# Altium footprint library WE-SHC.PcbLib: 139 footprints (part 6 of 10)
Each footprint in its own frame and in the unit in brackets; x right, y up, seen from the top. Pads: shape width x height; smd on the part's side, far side on the other; paste and mask are expansions set on the pad; w line width, h text height; cw(c..) or ccw(c..) is an arc to the next point about the centre after c.
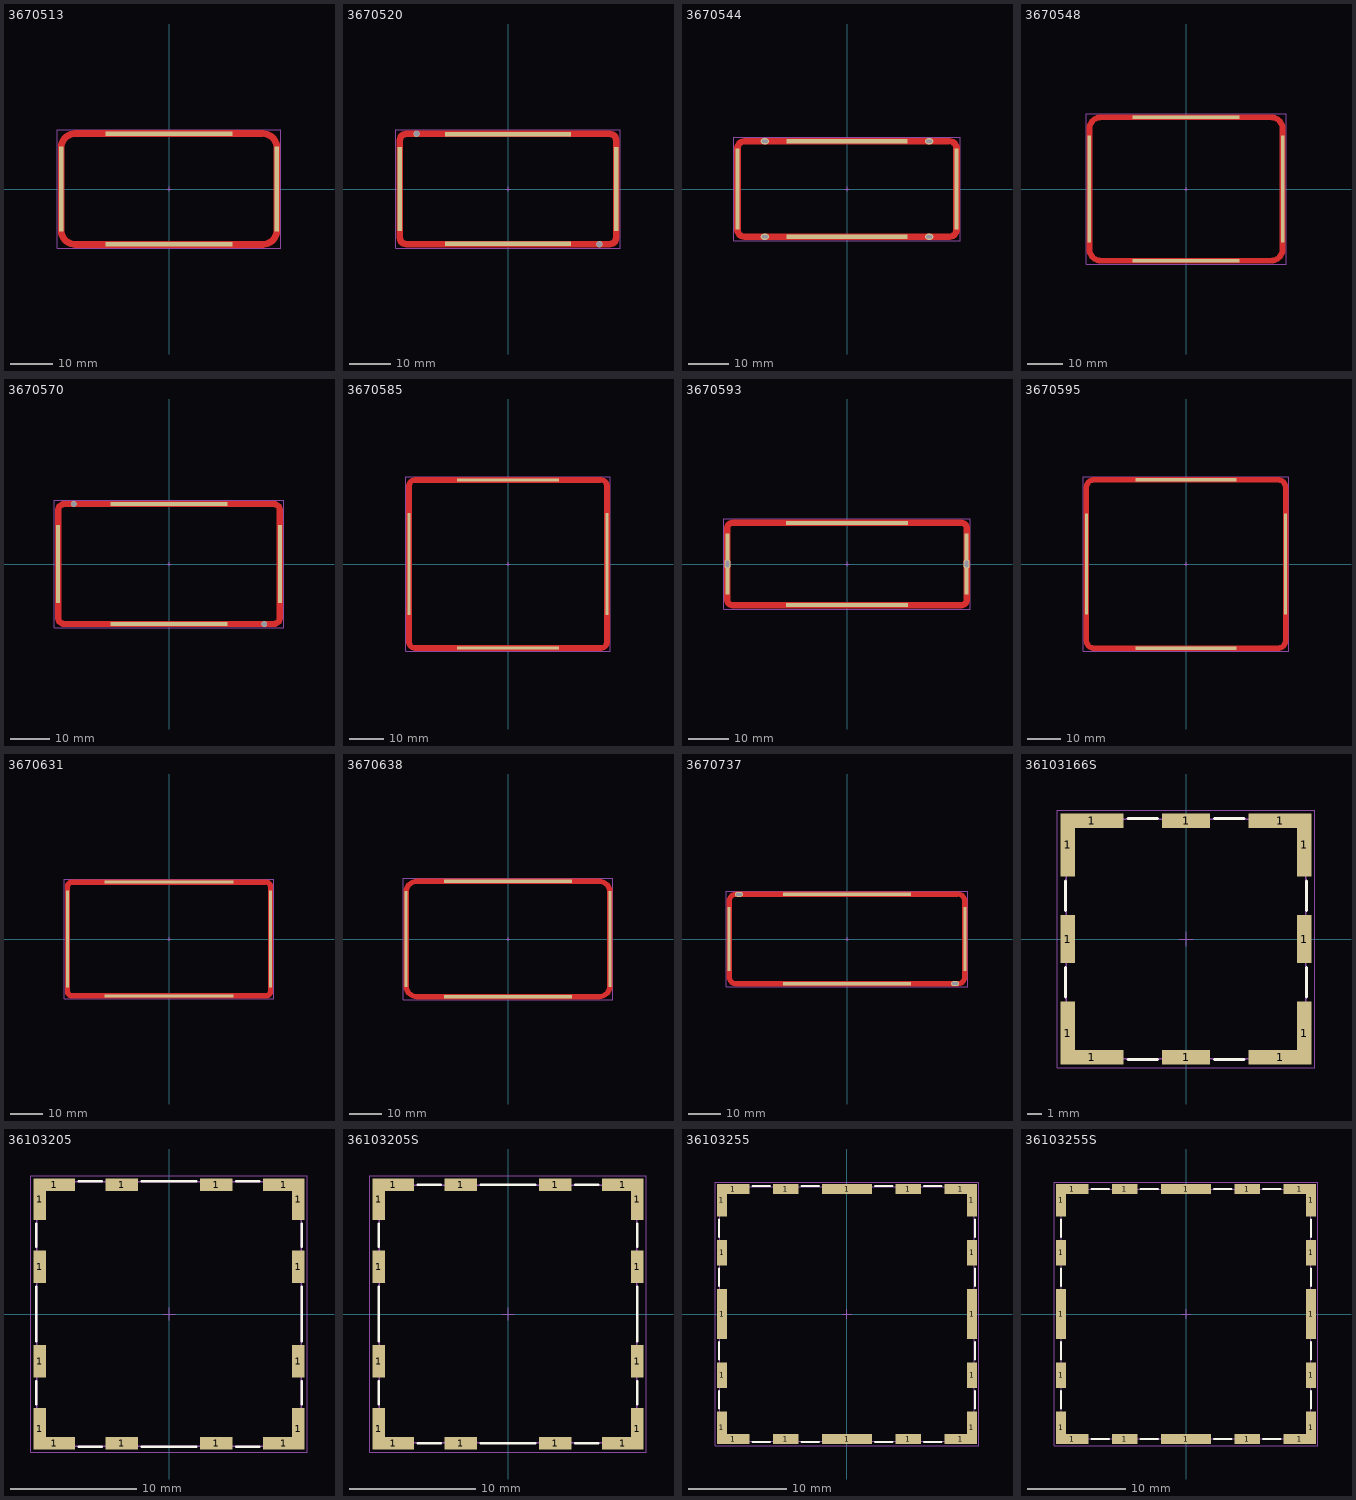
[diagram p5: the footprints below, top view; thin cyan lines are the x and y axes]

## 3670513 [mm] "Shielding Cabinet, SMT Frame Seamless, 51.3x26.5x9.5mm"
height 9.5
pads (4):
  rect 1x20 smd paste-2539.97 mask-2222: 1(-25.5,0) 1(25.5,0)
  rect 30x1 smd paste-2539.97 mask-2222: 1(0,-13.1) 1(0,13.1)
Top Layer:
  region: -26.25,-0.5 -26.25,-9.75 -26.25,-10.019 -26.18,-10.552 -26.041,-11.071 -25.835,-11.567 -25.566,-12.033 -25.239,-12.459 -24.859,-12.839 -24.433,-13.166 -23.967,-13.435 -23.471,-13.641 -22.952,-13.78 -22.419,-13.85 -22.15,-13.85 22.15,-13.85 22.419,-13.85 22.952,-13.78 23.471,-13.641 23.967,-13.435 24.433,-13.166 24.859,-12.839 25.239,-12.459 25.566,-12.033 25.835,-11.567 26.041,-11.071 26.18,-10.552 26.25,-10.019 26.25,-9.75 26.25,-0.5 24.75,-0.5 24.75,-9.75 24.737,-10.005 24.638,-10.505 24.443,-10.976 24.16,-11.399 23.799,-11.76 23.376,-12.043 22.905,-12.238 22.405,-12.337 22.15,-12.35 -22.15,-12.35 -22.405,-12.337 -22.905,-12.238 -23.376,-12.043 -23.799,-11.76 -24.16,-11.399 -24.443,-10.976 -24.638,-10.505 -24.737,-10.005 -24.75,-9.75 -24.75,-0.5
  region: -26.25,-1 -26.25,9.75 -26.25,10.019 -26.18,10.552 -26.041,11.071 -25.835,11.567 -25.566,12.033 -25.239,12.459 -24.859,12.839 -24.433,13.166 -23.967,13.435 -23.471,13.641 -22.952,13.78 -22.419,13.85 -22.15,13.85 22.15,13.85 22.419,13.85 22.952,13.78 23.471,13.641 23.967,13.435 24.433,13.166 24.859,12.839 25.239,12.459 25.566,12.033 25.835,11.567 26.041,11.071 26.18,10.552 26.25,10.019 26.25,9.75 26.25,-1 24.75,-1 24.75,9.75 24.737,10.005 24.638,10.505 24.443,10.976 24.16,11.399 23.799,11.76 23.376,12.043 22.905,12.238 22.405,12.337 22.15,12.35 -22.15,12.35 -22.405,12.337 -22.905,12.238 -23.376,12.043 -23.799,11.76 -24.16,11.399 -24.443,10.976 -24.638,10.505 -24.737,10.005 -24.75,9.75 -24.75,-1
Top Paste:
  region: -26.25,0.25 -26.25,9.75 -26.25,10.019 -26.18,10.552 -26.041,11.071 -25.835,11.567 -25.566,12.033 -25.239,12.459 -24.859,12.839 -24.433,13.166 -23.967,13.435 -23.471,13.641 -22.952,13.78 -22.419,13.85 -22.15,13.85 22.15,13.85 22.419,13.85 22.952,13.78 23.471,13.641 23.967,13.435 24.433,13.166 24.859,12.839 25.239,12.459 25.566,12.033 25.835,11.567 26.041,11.071 26.18,10.552 26.25,10.019 26.25,9.75 26.25,0.25 24.75,0.25 24.75,9.75 24.737,10.005 24.638,10.505 24.443,10.976 24.16,11.399 23.799,11.76 23.376,12.043 22.905,12.238 22.405,12.337 22.15,12.35 -22.15,12.35 -22.405,12.337 -22.905,12.238 -23.376,12.043 -23.799,11.76 -24.16,11.399 -24.443,10.976 -24.638,10.505 -24.737,10.005 -24.75,9.75 -24.75,0.25
  region: -26.25,-0.25 -26.25,-9.75 -26.25,-10.019 -26.18,-10.552 -26.041,-11.071 -25.835,-11.567 -25.566,-12.033 -25.239,-12.459 -24.859,-12.839 -24.433,-13.166 -23.967,-13.435 -23.471,-13.641 -22.952,-13.78 -22.419,-13.85 -22.15,-13.85 22.15,-13.85 22.419,-13.85 22.952,-13.78 23.471,-13.641 23.967,-13.435 24.433,-13.166 24.859,-12.839 25.239,-12.459 25.566,-12.033 25.835,-11.567 26.041,-11.071 26.18,-10.552 26.25,-10.019 26.25,-9.75 26.25,-0.25 24.75,-0.25 24.75,-9.75 24.737,-10.005 24.638,-10.505 24.443,-10.976 24.16,-11.399 23.799,-11.76 23.376,-12.043 22.905,-12.238 22.405,-12.337 22.15,-12.35 -22.15,-12.35 -22.405,-12.337 -22.905,-12.238 -23.376,-12.043 -23.799,-11.76 -24.16,-11.399 -24.443,-10.976 -24.638,-10.505 -24.737,-10.005 -24.75,-9.75 -24.75,-0.25
Notes:
  text "recommended tin paste thickness=0.5mm / customer to define the final stencil gap" at -7.85,-15.85 h0.5
Top Designator:
  text ".Designator" at -7.498,-0.5 h1.5
Top Component Outline:
  lines w0.1: -25.65,-9.75 ccw(c-22.15,-9.75) -22.15,-13.25 22.15,-13.25 ccw(c22.15,-9.75) 25.65,-9.75 25.65,9.75 ccw(c22.15,9.75) 22.15,13.25 -22.15,13.25 ccw(c-22.15,9.75) -25.65,9.75 -25.65,-9.75
Top 3D Body:
  lines w0.1: -25.65,-9.75 ccw(c-22.15,-9.75) -22.15,-13.25 22.15,-13.25 ccw(c22.15,-9.75) 25.65,-9.75 25.65,9.75 ccw(c22.15,9.75) 22.15,13.25 -22.15,13.25 ccw(c-22.15,9.75) -25.65,9.75 -25.65,-9.75
Top Courtyard:
  lines w0.05: -0.5,0 0.5,0 ; 0,-0.5 0,0.5 ; -26.45,-14.05 26.45,-14.05 26.45,14.05 -26.45,14.05 -26.45,-14.05
3D body "3670513.stp": height 9.5, standoff 0, extent -25.65,-13.25 25.65,13.25

## 3670520 [mm] "Shielding Cabinet, SMT Frame Seamless, 52x26.7x6mm"
height 6
pads (6):
  rect 1x20 smd paste-2539.97 mask-2222: 1(-25.85,0) 1(25.85,0)
  round 1.5 hole 1.3: 1(-21.85,13.2) 1(21.85,-13.2)
  rect 30x1 smd paste-2539.97 mask-2222: 1(0,-13.1) 1(0,13.1)
Top Layer:
  region: -26.6,-0.25 -26.6,-11.55 -26.6,-11.786 -26.508,-12.25 -26.327,-12.687 -26.064,-13.08 -25.73,-13.414 -25.337,-13.677 -24.9,-13.858 -24.436,-13.95 -24.2,-13.95 24.2,-13.95 24.436,-13.95 24.9,-13.858 25.337,-13.677 25.73,-13.414 26.064,-13.08 26.327,-12.687 26.508,-12.25 26.6,-11.786 26.6,-11.55 26.6,-0.25 25.1,-0.25 25.1,-11.55 25.096,-11.638 25.061,-11.811 24.994,-11.974 24.896,-12.121 24.771,-12.246 24.624,-12.344 24.461,-12.411 24.288,-12.446 24.2,-12.45 -24.2,-12.45 -24.288,-12.446 -24.461,-12.411 -24.624,-12.344 -24.771,-12.246 -24.896,-12.121 -24.994,-11.974 -25.061,-11.811 -25.096,-11.638 -25.1,-11.55 -25.1,-0.25
  region: -26.6,-1 -26.6,11.55 -26.6,11.786 -26.508,12.25 -26.327,12.687 -26.064,13.08 -25.73,13.414 -25.337,13.677 -24.9,13.858 -24.436,13.95 -24.2,13.95 24.2,13.95 24.436,13.95 24.9,13.858 25.337,13.677 25.73,13.414 26.064,13.08 26.327,12.687 26.508,12.25 26.6,11.786 26.6,11.55 26.6,-1 25.1,-1 25.1,11.55 25.096,11.638 25.061,11.811 24.994,11.974 24.896,12.121 24.771,12.246 24.624,12.344 24.461,12.411 24.288,12.446 24.2,12.45 -24.2,12.45 -24.288,12.446 -24.461,12.411 -24.624,12.344 -24.771,12.246 -24.896,12.121 -24.994,11.974 -25.061,11.811 -25.096,11.638 -25.1,11.55 -25.1,-1
Top Paste:
  region: -26.6,0.25 -26.6,11.55 -26.6,11.786 -26.508,12.25 -26.327,12.687 -26.064,13.08 -25.73,13.414 -25.337,13.677 -24.9,13.858 -24.436,13.95 -24.2,13.95 24.2,13.95 24.436,13.95 24.9,13.858 25.337,13.677 25.73,13.414 26.064,13.08 26.327,12.687 26.508,12.25 26.6,11.786 26.6,11.55 26.6,0.25 25.1,0.25 25.1,11.55 25.096,11.638 25.061,11.811 24.994,11.974 24.896,12.121 24.771,12.246 24.624,12.344 24.461,12.411 24.288,12.446 24.2,12.45 -24.2,12.45 -24.288,12.446 -24.461,12.411 -24.624,12.344 -24.771,12.246 -24.896,12.121 -24.994,11.974 -25.061,11.811 -25.096,11.638 -25.1,11.55 -25.1,0.25
  region: -26.6,-0.25 -26.6,-11.55 -26.6,-11.786 -26.508,-12.25 -26.327,-12.687 -26.064,-13.08 -25.73,-13.414 -25.337,-13.677 -24.9,-13.858 -24.436,-13.95 -24.2,-13.95 24.2,-13.95 24.436,-13.95 24.9,-13.858 25.337,-13.677 25.73,-13.414 26.064,-13.08 26.327,-12.687 26.508,-12.25 26.6,-11.786 26.6,-11.55 26.6,-0.25 25.1,-0.25 25.1,-11.55 25.096,-11.638 25.061,-11.811 24.994,-11.974 24.896,-12.121 24.771,-12.246 24.624,-12.344 24.461,-12.411 24.288,-12.446 24.2,-12.45 -24.2,-12.45 -24.288,-12.446 -24.461,-12.411 -24.624,-12.344 -24.771,-12.246 -24.896,-12.121 -24.994,-11.974 -25.061,-11.811 -25.096,-11.638 -25.1,-11.55 -25.1,-0.25
Notes:
  text "recommended tin paste thickness=0.5mm / customer to define the final stencil gap" at -7.85,-15.85 h0.5
Top Designator:
  text ".Designator" at -7.498,-0.5 h1.5
Top Component Outline:
  lines w0.1: -26,-11.6 ccw(c-24.25,-11.6) -24.25,-13.35 24.25,-13.35 ccw(c24.25,-11.6) 26,-11.6 26,11.6 ccw(c24.25,11.6) 24.25,13.35 -24.25,13.35 ccw(c-24.25,11.6) -26,11.6 -26,-11.6
Top 3D Body:
  lines w0.1: -26,-11.6 ccw(c-24.25,-11.6) -24.25,-13.35 24.25,-13.35 ccw(c24.25,-11.6) 26,-11.6 26,11.6 ccw(c24.25,11.6) 24.25,13.35 -24.25,13.35 ccw(c-24.25,11.6) -26,11.6 -26,-11.6
Top Courtyard:
  lines w0.05: -0.5,0 0.5,0 ; 0,-0.5 0,0.5 ; -26.8,-14.15 -26.8,14.15 26.8,14.15 26.8,-14.15 -26.8,-14.15
3D body "3670520.stp": height 6, standoff -1.2, extent -26,-13.35 26,13.35

## 3670544 [mm] "Shielding Cabinet, SMT Frame Seamless, 54.4x23.9x7.5mm"
height 7.5
pads (8):
  rect 1x20 smd paste-2539.97 mask-2222: 1(-27.05,0) 1(27.05,0)
  oval 2.1x1.5 hole 0.8 slot 1.4 at 0 deg: 1(-20.3,-11.8) 1(-20.3,11.8) 1(20.3,-11.8) 1(20.3,11.8)
  rect 30x1 smd paste-2539.97 mask-2222: 1(0,-11.8) 1(0,11.8)
Top Layer:
  region: -27.8,-0.25 -27.8,-10.05 -27.8,-10.296 -27.704,-10.779 -27.515,-11.234 -27.242,-11.644 -26.894,-11.992 -26.484,-12.265 -26.029,-12.454 -25.546,-12.55 -25.3,-12.55 25.3,-12.55 25.546,-12.55 26.029,-12.454 26.484,-12.265 26.894,-11.992 27.242,-11.644 27.515,-11.234 27.704,-10.779 27.8,-10.296 27.8,-10.05 27.8,-0.25 26.3,-0.25 26.3,-10.05 26.295,-10.148 26.257,-10.34 26.182,-10.521 26.073,-10.684 25.934,-10.823 25.771,-10.932 25.59,-11.007 25.398,-11.045 25.3,-11.05 -25.3,-11.05 -25.398,-11.045 -25.59,-11.007 -25.771,-10.932 -25.934,-10.823 -26.073,-10.684 -26.182,-10.521 -26.257,-10.34 -26.295,-10.148 -26.3,-10.05 -26.3,-0.25
  region: -27.8,-1 -27.8,10.05 -27.8,10.296 -27.704,10.779 -27.515,11.234 -27.242,11.644 -26.894,11.992 -26.484,12.265 -26.029,12.454 -25.546,12.55 -25.3,12.55 25.3,12.55 25.546,12.55 26.029,12.454 26.484,12.265 26.894,11.992 27.242,11.644 27.515,11.234 27.704,10.779 27.8,10.296 27.8,10.05 27.8,-1 26.3,-1 26.3,10.05 26.295,10.148 26.257,10.34 26.182,10.521 26.073,10.684 25.934,10.823 25.771,10.932 25.59,11.007 25.398,11.045 25.3,11.05 -25.3,11.05 -25.398,11.045 -25.59,11.007 -25.771,10.932 -25.934,10.823 -26.073,10.684 -26.182,10.521 -26.257,10.34 -26.295,10.148 -26.3,10.05 -26.3,-1
Top Paste:
  region: -27.8,0.25 -27.8,10.05 -27.8,10.296 -27.704,10.779 -27.515,11.234 -27.242,11.644 -26.894,11.992 -26.484,12.265 -26.029,12.454 -25.546,12.55 -25.3,12.55 25.3,12.55 25.546,12.55 26.029,12.454 26.484,12.265 26.894,11.992 27.242,11.644 27.515,11.234 27.704,10.779 27.8,10.296 27.8,10.05 27.8,0.25 26.3,0.25 26.3,10.05 26.295,10.148 26.257,10.34 26.182,10.521 26.073,10.684 25.934,10.823 25.771,10.932 25.59,11.007 25.398,11.045 25.3,11.05 -25.3,11.05 -25.398,11.045 -25.59,11.007 -25.771,10.932 -25.934,10.823 -26.073,10.684 -26.182,10.521 -26.257,10.34 -26.295,10.148 -26.3,10.05 -26.3,0.25
  region: -27.8,-0.25 -27.8,-10.05 -27.8,-10.296 -27.704,-10.779 -27.515,-11.234 -27.242,-11.644 -26.894,-11.992 -26.484,-12.265 -26.029,-12.454 -25.546,-12.55 -25.3,-12.55 25.3,-12.55 25.546,-12.55 26.029,-12.454 26.484,-12.265 26.894,-11.992 27.242,-11.644 27.515,-11.234 27.704,-10.779 27.8,-10.296 27.8,-10.05 27.8,-0.25 26.3,-0.25 26.3,-10.05 26.295,-10.148 26.257,-10.34 26.182,-10.521 26.073,-10.684 25.934,-10.823 25.771,-10.932 25.59,-11.007 25.398,-11.045 25.3,-11.05 -25.3,-11.05 -25.398,-11.045 -25.59,-11.007 -25.771,-10.932 -25.934,-10.823 -26.073,-10.684 -26.182,-10.521 -26.257,-10.34 -26.295,-10.148 -26.3,-10.05 -26.3,-0.25
Notes:
  text "recommended tin paste thickness=0.5mm / customer to define the final stencil gap" at -7.8,-14.5 h0.5
Top Designator:
  text ".Designator" at -7.498,-0.5 h1.5
Top Component Outline:
  lines w0.1: -27.2,-10.2 ccw(c-25.45,-10.2) -25.45,-11.95 25.45,-11.95 ccw(c25.45,-10.2) 27.2,-10.2 27.2,10.2 ccw(c25.45,10.2) 25.45,11.95 -25.45,11.95 ccw(c-25.45,10.2) -27.2,10.2 -27.2,-10.2
Top 3D Body:
  lines w0.1: -27.2,-10.2 ccw(c-25.45,-10.2) -25.45,-11.95 25.45,-11.95 ccw(c25.45,-10.2) 27.2,-10.2 27.2,10.2 ccw(c25.45,10.2) 25.45,11.95 -25.45,11.95 ccw(c-25.45,10.2) -27.2,10.2 -27.2,-10.2
Top Courtyard:
  lines w0.05: -0.5,0 0.5,0 ; 0,-0.5 0,0.5 ; -28,-12.75 -28,12.75 28,12.75 28,-12.75 -28,-12.75
3D body "3670544.stp": height 7.5, standoff -1.2, extent -27.2,-11.95 27.2,11.95

## 3670548 [mm] "Shielding Cabinet, SMT Frame Seamless, 54.8x40.8x11mm"
height 11
pads (4):
  rect 1x30 smd paste-2539.97 mask-2222: 1(-27.15,0) 1(27.15,0)
  rect 30x1 smd paste-2539.97 mask-2222: 1(0,-20.15) 1(0,20.15)
Top Layer:
  region: -27.9,-0.25 -27.9,-16.9 -27.9,-17.162 -27.832,-17.682 -27.696,-18.189 -27.495,-18.673 -27.233,-19.127 -26.914,-19.543 -26.543,-19.914 -26.127,-20.233 -25.673,-20.495 -25.189,-20.696 -24.682,-20.832 -24.162,-20.9 -23.9,-20.9 23.9,-20.9 24.162,-20.9 24.682,-20.832 25.189,-20.696 25.673,-20.495 26.127,-20.233 26.543,-19.914 26.914,-19.543 27.233,-19.127 27.495,-18.673 27.696,-18.189 27.832,-17.682 27.9,-17.162 27.9,-16.9 27.9,-0.25 26.4,-0.25 26.4,-16.9 26.388,-17.145 26.292,-17.626 26.105,-18.078 25.833,-18.486 25.486,-18.833 25.078,-19.105 24.626,-19.292 24.145,-19.388 23.9,-19.4 -23.9,-19.4 -24.145,-19.388 -24.626,-19.292 -25.078,-19.105 -25.486,-18.833 -25.833,-18.486 -26.105,-18.078 -26.292,-17.626 -26.388,-17.145 -26.4,-16.9 -26.4,-0.25
  region: -27.9,-1 -27.9,16.9 -27.9,17.162 -27.832,17.682 -27.696,18.189 -27.495,18.673 -27.233,19.127 -26.914,19.543 -26.543,19.914 -26.127,20.233 -25.673,20.495 -25.189,20.696 -24.682,20.832 -24.162,20.9 -23.9,20.9 23.9,20.9 24.162,20.9 24.682,20.832 25.189,20.696 25.673,20.495 26.127,20.233 26.543,19.914 26.914,19.543 27.233,19.127 27.495,18.673 27.696,18.189 27.832,17.682 27.9,17.162 27.9,16.9 27.9,-1 26.4,-1 26.4,16.9 26.388,17.145 26.292,17.626 26.105,18.078 25.833,18.486 25.486,18.833 25.078,19.105 24.626,19.292 24.145,19.388 23.9,19.4 -23.9,19.4 -24.145,19.388 -24.626,19.292 -25.078,19.105 -25.486,18.833 -25.833,18.486 -26.105,18.078 -26.292,17.626 -26.388,17.145 -26.4,16.9 -26.4,-1
Top Paste:
  region: -27.9,0.25 -27.9,16.9 -27.9,17.162 -27.832,17.682 -27.696,18.189 -27.495,18.673 -27.233,19.127 -26.914,19.543 -26.543,19.914 -26.127,20.233 -25.673,20.495 -25.189,20.696 -24.682,20.832 -24.162,20.9 -23.9,20.9 23.9,20.9 24.162,20.9 24.682,20.832 25.189,20.696 25.673,20.495 26.127,20.233 26.543,19.914 26.914,19.543 27.233,19.127 27.495,18.673 27.696,18.189 27.832,17.682 27.9,17.162 27.9,16.9 27.9,0.25 26.4,0.25 26.4,16.9 26.388,17.145 26.292,17.626 26.105,18.078 25.833,18.486 25.486,18.833 25.078,19.105 24.626,19.292 24.145,19.388 23.9,19.4 -23.9,19.4 -24.145,19.388 -24.626,19.292 -25.078,19.105 -25.486,18.833 -25.833,18.486 -26.105,18.078 -26.292,17.626 -26.388,17.145 -26.4,16.9 -26.4,0.25
  region: -27.9,-0.25 -27.9,-16.9 -27.9,-17.162 -27.832,-17.682 -27.696,-18.189 -27.495,-18.673 -27.233,-19.127 -26.914,-19.543 -26.543,-19.914 -26.127,-20.233 -25.673,-20.495 -25.189,-20.696 -24.682,-20.832 -24.162,-20.9 -23.9,-20.9 23.9,-20.9 24.162,-20.9 24.682,-20.832 25.189,-20.696 25.673,-20.495 26.127,-20.233 26.543,-19.914 26.914,-19.543 27.233,-19.127 27.495,-18.673 27.696,-18.189 27.832,-17.682 27.9,-17.162 27.9,-16.9 27.9,-0.25 26.4,-0.25 26.4,-16.9 26.388,-17.145 26.292,-17.626 26.105,-18.078 25.833,-18.486 25.486,-18.833 25.078,-19.105 24.626,-19.292 24.145,-19.388 23.9,-19.4 -23.9,-19.4 -24.145,-19.388 -24.626,-19.292 -25.078,-19.105 -25.486,-18.833 -25.833,-18.486 -26.105,-18.078 -26.292,-17.626 -26.388,-17.145 -26.4,-16.9 -26.4,-0.25
Notes:
  text "recommended tin paste thickness=0.5mm / customer to define the final stencil gap" at -7,-23.05 h0.5
Top Designator:
  text ".Designator" at -7.498,-0.5 h1.5
Top Component Outline:
  lines w0.1: -27.4,-16.9 ccw(c-23.9,-16.9) -23.9,-20.4 23.9,-20.4 ccw(c23.9,-16.9) 27.4,-16.9 27.4,16.9 ccw(c23.9,16.9) 23.9,20.4 -23.9,20.4 ccw(c-23.9,16.9) -27.4,16.9 -27.4,-16.9
Top 3D Body:
  lines w0.1: -27.4,-16.9 ccw(c-23.9,-16.9) -23.9,-20.4 23.9,-20.4 ccw(c23.9,-16.9) 27.4,-16.9 27.4,16.9 ccw(c23.9,16.9) 23.9,20.4 -23.9,20.4 ccw(c-23.9,16.9) -27.4,16.9 -27.4,-16.9
Top Courtyard:
  lines w0.05: -0.5,0 0.5,0 ; 0,-0.5 0,0.5 ; -28.1,-21.1 -28.1,21.1 28.1,21.1 28.1,-21.1 -28.1,-21.1
3D body "3670548.stp": height 11, standoff 0, extent -27.4,-20.4 27.4,20.4

## 3670570 [mm] "Shielding Cabinet, SMT Frame Seamless, 57x31x6mm"
height 6
pads (6):
  rect 1x20 smd paste-2539.97 mask-2222: 1(-28.35,0) 1(28.35,0)
  round 1.5 hole 1.3: 1(-24.35,15.35) 1(24.35,-15.35)
  rect 30x1 smd paste-2539.97 mask-2222: 1(0,-15.35) 1(0,15.35)
Top Layer:
  region: -29.1,-1 -29.1,13.7 -29.1,13.936 -29.008,14.4 -28.827,14.837 -28.564,15.23 -28.23,15.564 -27.837,15.827 -27.4,16.008 -26.936,16.1 -26.7,16.1 26.7,16.1 26.936,16.1 27.4,16.008 27.837,15.827 28.23,15.564 28.564,15.23 28.827,14.837 29.008,14.4 29.1,13.936 29.1,13.7 29.1,-1 27.6,-1 27.6,13.7 27.596,13.788 27.561,13.961 27.494,14.124 27.396,14.271 27.271,14.396 27.124,14.494 26.961,14.561 26.788,14.596 26.7,14.6 -26.7,14.6 -26.788,14.596 -26.961,14.561 -27.124,14.494 -27.271,14.396 -27.396,14.271 -27.494,14.124 -27.561,13.961 -27.596,13.788 -27.6,13.7 -27.6,-1
  region: -29.1,-0.25 -29.1,-13.7 -29.1,-13.936 -29.008,-14.4 -28.827,-14.837 -28.564,-15.23 -28.23,-15.564 -27.837,-15.827 -27.4,-16.008 -26.936,-16.1 -26.7,-16.1 26.7,-16.1 26.936,-16.1 27.4,-16.008 27.837,-15.827 28.23,-15.564 28.564,-15.23 28.827,-14.837 29.008,-14.4 29.1,-13.936 29.1,-13.7 29.1,-0.25 27.6,-0.25 27.6,-13.7 27.596,-13.788 27.561,-13.961 27.494,-14.124 27.396,-14.271 27.271,-14.396 27.124,-14.494 26.961,-14.561 26.788,-14.596 26.7,-14.6 -26.7,-14.6 -26.788,-14.596 -26.961,-14.561 -27.124,-14.494 -27.271,-14.396 -27.396,-14.271 -27.494,-14.124 -27.561,-13.961 -27.596,-13.788 -27.6,-13.7 -27.6,-0.25
Top Paste:
  region: -29.1,-0.25 -29.1,-13.7 -29.1,-13.936 -29.008,-14.4 -28.827,-14.837 -28.564,-15.23 -28.23,-15.564 -27.837,-15.827 -27.4,-16.008 -26.936,-16.1 -26.7,-16.1 26.7,-16.1 26.936,-16.1 27.4,-16.008 27.837,-15.827 28.23,-15.564 28.564,-15.23 28.827,-14.837 29.008,-14.4 29.1,-13.936 29.1,-13.7 29.1,-0.25 27.6,-0.25 27.6,-13.7 27.596,-13.788 27.561,-13.961 27.494,-14.124 27.396,-14.271 27.271,-14.396 27.124,-14.494 26.961,-14.561 26.788,-14.596 26.7,-14.6 -26.7,-14.6 -26.788,-14.596 -26.961,-14.561 -27.124,-14.494 -27.271,-14.396 -27.396,-14.271 -27.494,-14.124 -27.561,-13.961 -27.596,-13.788 -27.6,-13.7 -27.6,-0.25
  region: -29.1,0.25 -29.1,13.7 -29.1,13.936 -29.008,14.4 -28.827,14.837 -28.564,15.23 -28.23,15.564 -27.837,15.827 -27.4,16.008 -26.936,16.1 -26.7,16.1 26.7,16.1 26.936,16.1 27.4,16.008 27.837,15.827 28.23,15.564 28.564,15.23 28.827,14.837 29.008,14.4 29.1,13.936 29.1,13.7 29.1,0.25 27.6,0.25 27.6,13.7 27.596,13.788 27.561,13.961 27.494,14.124 27.396,14.271 27.271,14.396 27.124,14.494 26.961,14.561 26.788,14.596 26.7,14.6 -26.7,14.6 -26.788,14.596 -26.961,14.561 -27.124,14.494 -27.271,14.396 -27.396,14.271 -27.494,14.124 -27.561,13.961 -27.596,13.788 -27.6,13.7 -27.6,0.25
Notes:
  text "recommended tin paste thickness=0.5mm / customer to define the final stencil gap" at -7.4,-18.2 h0.5
Top Designator:
  text ".Designator" at -7.498,-0.5 h1.5
Top Component Outline:
  lines w0.1: -28.5,-13.75 ccw(c-26.75,-13.75) -26.75,-15.5 26.75,-15.5 ccw(c26.75,-13.75) 28.5,-13.75 28.5,13.75 ccw(c26.75,13.75) 26.75,15.5 -26.75,15.5 ccw(c-26.75,13.75) -28.5,13.75 -28.5,-13.75
Top 3D Body:
  lines w0.1: -28.5,-13.75 ccw(c-26.75,-13.75) -26.75,-15.5 26.75,-15.5 ccw(c26.75,-13.75) 28.5,-13.75 28.5,13.75 ccw(c26.75,13.75) 26.75,15.5 -26.75,15.5 ccw(c-26.75,13.75) -28.5,13.75 -28.5,-13.75
Top Courtyard:
  lines w0.05: -0.5,0 0.5,0 ; 0,-0.5 0,0.5 ; -29.3,-16.3 29.3,-16.3 29.3,16.3 -29.3,16.3 -29.3,-16.3
3D body "3670570.stp": height 6, standoff -1.2, extent -28.5,-15.5 28.5,15.5

## 3670585 [mm] "Shielding Cabinet, SMT Frame Seamless, 58.5x49.7x4.7mm"
height 4.7
pads (4):
  rect 1x30 smd paste-2539.97 mask-2222: 1(-29.1,0) 1(29.1,0)
  rect 30x1 smd paste-2539.97 mask-2222: 1(0,-24.7) 1(0,24.7)
Top Layer:
  region: -29.85,-1 -29.85,22.85 -29.85,23.106 -29.75,23.608 -29.554,24.082 -29.27,24.507 -28.907,24.87 -28.482,25.154 -28.008,25.35 -27.506,25.45 -27.25,25.45 27.25,25.45 27.506,25.45 28.008,25.35 28.482,25.154 28.907,24.87 29.27,24.507 29.554,24.082 29.75,23.608 29.85,23.106 29.85,22.85 29.85,-1 28.35,-1 28.35,22.85 28.345,22.958 28.303,23.169 28.22,23.369 28.1,23.548 27.948,23.7 27.769,23.82 27.569,23.903 27.358,23.945 27.25,23.95 -27.25,23.95 -27.358,23.945 -27.569,23.903 -27.769,23.82 -27.948,23.7 -28.1,23.548 -28.22,23.369 -28.303,23.169 -28.345,22.958 -28.35,22.85 -28.35,-1
  region: -29.85,-0.25 -29.85,-22.85 -29.85,-23.106 -29.75,-23.608 -29.554,-24.082 -29.27,-24.507 -28.907,-24.87 -28.482,-25.154 -28.008,-25.35 -27.506,-25.45 -27.25,-25.45 27.25,-25.45 27.506,-25.45 28.008,-25.35 28.482,-25.154 28.907,-24.87 29.27,-24.507 29.554,-24.082 29.75,-23.608 29.85,-23.106 29.85,-22.85 29.85,-0.25 28.35,-0.25 28.35,-22.85 28.345,-22.958 28.303,-23.169 28.22,-23.369 28.1,-23.548 27.948,-23.7 27.769,-23.82 27.569,-23.903 27.358,-23.945 27.25,-23.95 -27.25,-23.95 -27.358,-23.945 -27.569,-23.903 -27.769,-23.82 -27.948,-23.7 -28.1,-23.548 -28.22,-23.369 -28.303,-23.169 -28.345,-22.958 -28.35,-22.85 -28.35,-0.25
Top Paste:
  region: -29.85,-0.25 -29.85,-22.85 -29.85,-23.106 -29.75,-23.608 -29.554,-24.082 -29.27,-24.507 -28.907,-24.87 -28.482,-25.154 -28.008,-25.35 -27.506,-25.45 -27.25,-25.45 27.25,-25.45 27.506,-25.45 28.008,-25.35 28.482,-25.154 28.907,-24.87 29.27,-24.507 29.554,-24.082 29.75,-23.608 29.85,-23.106 29.85,-22.85 29.85,-0.25 28.35,-0.25 28.35,-22.85 28.345,-22.958 28.303,-23.169 28.22,-23.369 28.1,-23.548 27.948,-23.7 27.769,-23.82 27.569,-23.903 27.358,-23.945 27.25,-23.95 -27.25,-23.95 -27.358,-23.945 -27.569,-23.903 -27.769,-23.82 -27.948,-23.7 -28.1,-23.548 -28.22,-23.369 -28.303,-23.169 -28.345,-22.958 -28.35,-22.85 -28.35,-0.25
  region: -29.85,0.25 -29.85,22.85 -29.85,23.106 -29.75,23.608 -29.554,24.082 -29.27,24.507 -28.907,24.87 -28.482,25.154 -28.008,25.35 -27.506,25.45 -27.25,25.45 27.25,25.45 27.506,25.45 28.008,25.35 28.482,25.154 28.907,24.87 29.27,24.507 29.554,24.082 29.75,23.608 29.85,23.106 29.85,22.85 29.85,0.25 28.35,0.25 28.35,22.85 28.345,22.958 28.303,23.169 28.22,23.369 28.1,23.548 27.948,23.7 27.769,23.82 27.569,23.903 27.358,23.945 27.25,23.95 -27.25,23.95 -27.358,23.945 -27.569,23.903 -27.769,23.82 -27.948,23.7 -28.1,23.548 -28.22,23.369 -28.303,23.169 -28.345,22.958 -28.35,22.85 -28.35,0.25